# Altium footprint library Libraries_2014_0618.PcbLib: 391 footprints (part 9 of 25)
Each footprint in its own frame and in the unit in brackets; x right, y up, seen from the top. Pads: shape width x height; smd on the part's side, far side on the other; paste and mask are expansions set on the pad; w line width, h text height; cw(c..) or ccw(c..) is an arc to the next point about the centre after c.
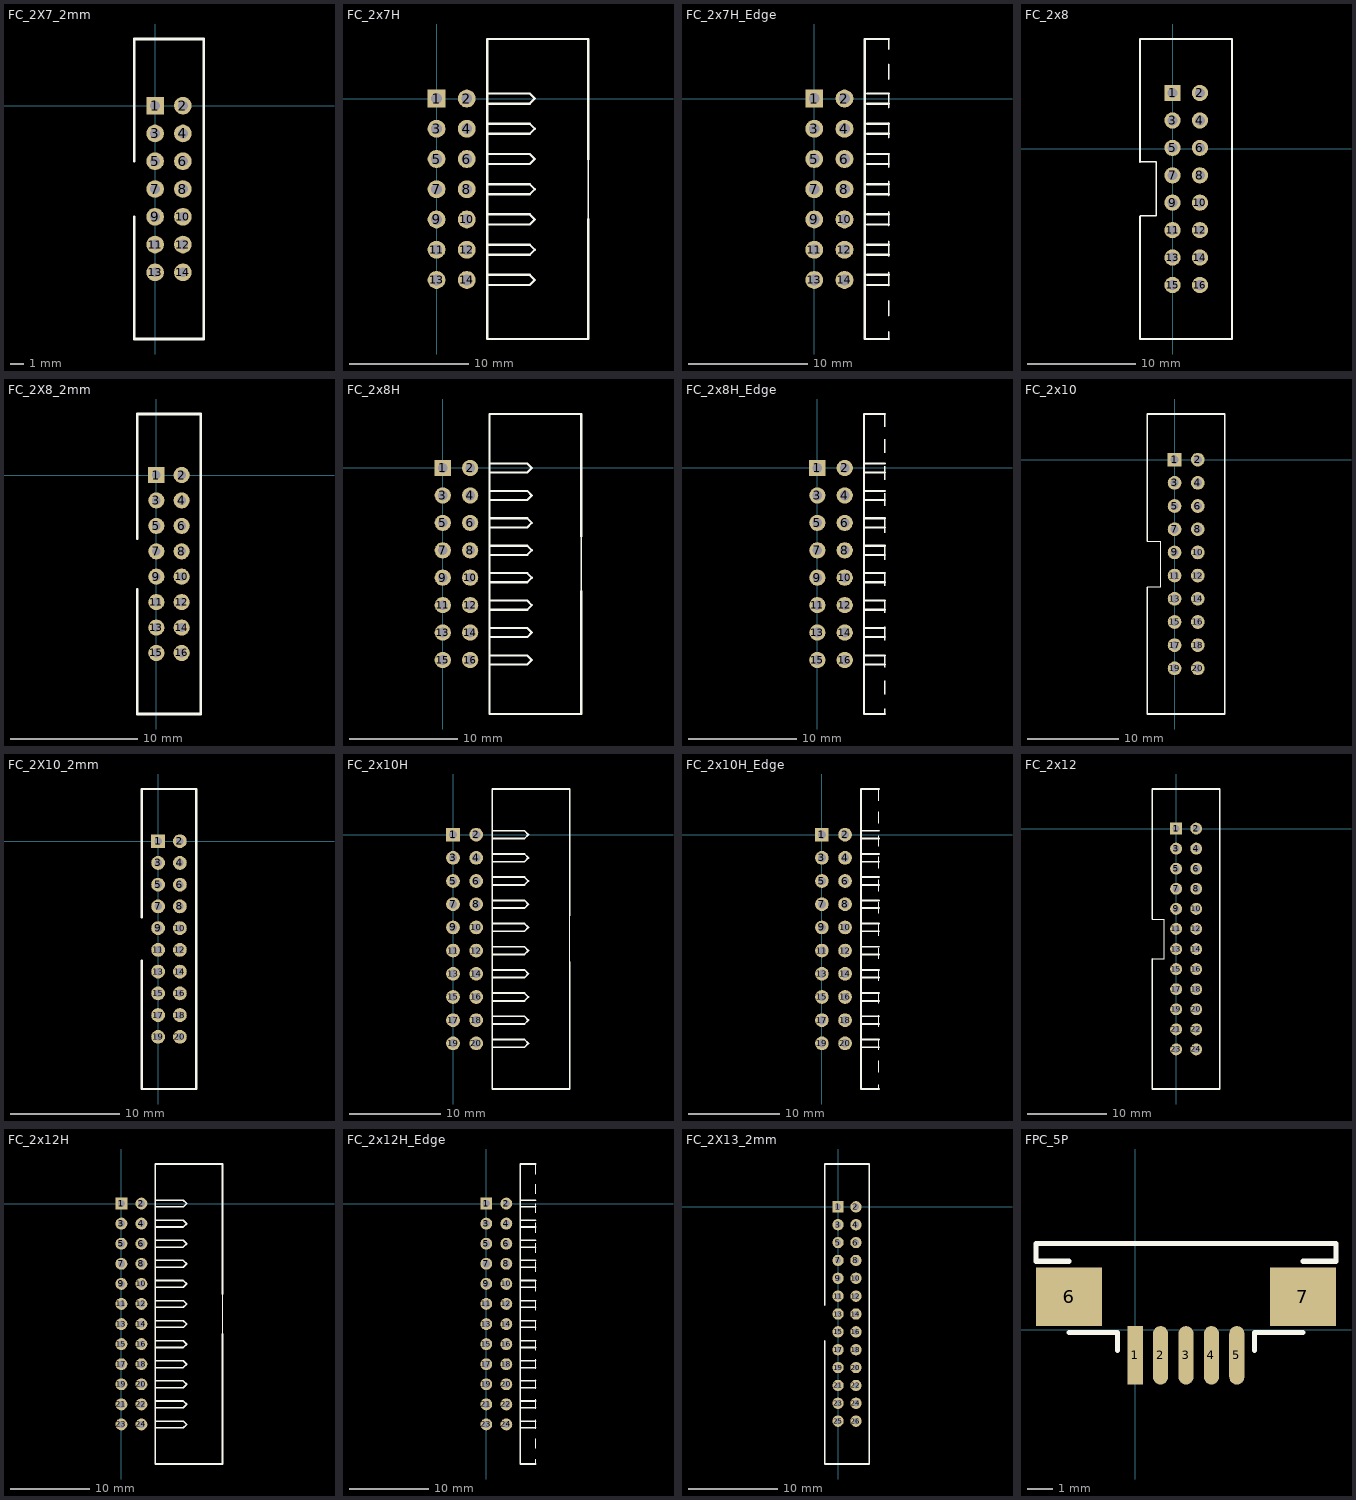
[diagram p8: the footprints below, top view; thin cyan lines are the x and y axes]

## FC_2X7_2mm [mm]
pads (14):
  rect 1.27x1.27 hole 0.7: 1(0,0)
  round 1.27 hole 0.7: 2(2,0) 3(0,-2) 4(2,-2) 5(0,-4) 6(2,-4) 7(0,-6) 8(2,-6) 9(0,-8) 10(2,-8) 11(0,-10) 12(2,-10) 13(0,-12) 14(2,-12)
Top Overlay:
  lines w0.2: -1.5,-8 -1.5,-16.8 3.5,-16.8 3.5,4.8 -1.5,4.8 -1.5,-4

## FC_2x7H [mm] "Connector; Header; 6x2 Position"
pads (14):
  rect 1.5x1.5 hole 0.9: 1(0,0)
  round 1.5 hole 0.9: 2(2.54,0) 3(0,-2.54) 4(2.54,-2.54) 5(0,-5.08) 6(2.54,-5.08) 7(0,-7.62) 8(2.54,-7.62) 9(0,-10.16) 10(2.54,-10.16) 11(0,-12.7) 12(2.54,-12.7) 13(0,-15.24) 14(2.54,-15.24)
Top Overlay:
  lines w0.127: 12.75,-10.12 12.75,-5.12
  lines w0.2: 4.44,-15.663 7.827,-15.663 8.25,-15.24 7.827,-14.817 4.44,-14.817 ; 4.44,-13.123 7.827,-13.123 8.25,-12.7 7.827,-12.277 4.44,-12.277 ; 4.44,-10.583 7.827,-10.583 8.25,-10.16 7.827,-9.737 4.44,-9.737 ; 4.44,-8.043 7.827,-8.043 8.25,-7.62 7.827,-7.197 4.44,-7.197 ; 4.44,-5.503 7.827,-5.503 8.25,-5.08 7.827,-4.657 4.44,-4.657 ; 4.44,-2.963 7.827,-2.963 8.25,-2.54 7.827,-2.117 4.44,-2.117 ; 4.44,-0.423 7.827,-0.423 8.25,0 7.827,0.423 4.44,0.423 ; 12.75,-10.14 12.75,-12.66 12.75,-20.2 4.25,-20.2 4.25,5 ; 12.75,-5.1 12.75,-2.58 12.75,5 ; 4.25,5 12.75,5 ; 4.25,5 12.75,5

## FC_2x7H_Edge [mm] "Connector; Header; 6x2 Position"
pads (14):
  rect 1.5x1.5 hole 0.9: 1(0,0)
  round 1.5 hole 0.9: 2(2.54,0) 3(0,-2.54) 4(2.54,-2.54) 5(0,-5.08) 6(2.54,-5.08) 7(0,-7.62) 8(2.54,-7.62) 9(0,-10.16) 10(2.54,-10.16) 11(0,-12.7) 12(2.54,-12.7) 13(0,-15.24) 14(2.54,-15.24)
Top Overlay:
  lines w0.127: 6.25,-20.2 6.25,-19.575 ; 6.25,-18.235 6.25,-16.985 ; 6.25,-15.735 6.25,-14.575 ; 6.25,-13.235 6.25,-11.985 ; 6.25,-10.685 6.25,-9.525 ; 6.25,-8.185 6.25,-6.935 ; 6.25,-5.785 6.25,-4.625 ; 6.25,-3.285 6.25,-2.035 ; 6.25,-0.785 6.25,0.375 ; 6.25,1.625 6.25,2.875 ; 6.25,4.125 6.25,4.91
  lines w0.2: 4.44,-15.663 6.25,-15.663 ; 4.44,-14.817 6.25,-14.817 ; 4.44,-13.123 6.25,-13.123 ; 4.44,-12.277 6.25,-12.277 ; 4.44,-10.583 6.25,-10.583 ; 4.44,-9.737 6.25,-9.737 ; 4.44,-8.043 6.25,-8.043 ; 4.44,-7.197 6.25,-7.197 ; 4.44,-5.503 6.25,-5.503 ; 4.44,-4.657 6.25,-4.657 ; 4.44,-2.963 6.25,-2.963 ; 4.44,-2.117 6.25,-2.117 ; 4.44,-0.423 6.25,-0.423 ; 4.44,0.423 6.25,0.423 ; 6.25,-20.2 4.25,-20.2 4.25,5 6.25,5

## FC_2x8 [mm] "Connector; Header; 6x2 Position"
pads (16):
  rect 1.5x1.5 hole 0.9: 1(0,5.16)
  round 1.5 hole 0.9: 2(2.54,5.16) 3(0,2.62) 4(2.54,2.62) 5(0,0.08) 6(2.54,0.08) 7(0,-2.46) 8(2.54,-2.46) 9(0,-5) 10(2.54,-5) 11(0,-7.54) 12(2.54,-7.54) 13(0,-10.08) 14(2.54,-10.08) 15(0,-12.62) 16(2.54,-12.62)
Top Overlay:
  lines w0.127: -3,-6.22 -1.5,-6.22 -1.5,-1.22 -3,-1.22
  lines w0.2: -3,-6.27 -3,-8.79 -3,-17.62 5.5,-17.62 5.5,10.16 -3,10.16 -3,0.04 -3,-1.22

## FC_2X8_2mm [mm]
pads (16):
  rect 1.27x1.27 hole 0.7: 1(0,0)
  round 1.27 hole 0.7: 2(2,0) 3(0,-2) 4(2,-2) 5(0,-4) 6(2,-4) 7(0,-6) 8(2,-6) 9(0,-8) 10(2,-8) 11(0,-10) 12(2,-10) 13(0,-12) 14(2,-12) 15(0,-14) 16(2,-14)
Top Overlay:
  lines w0.2: -1.5,-9 -1.5,-18.8 3.5,-18.8 3.5,4.8 -1.5,4.8 -1.5,-5

## FC_2x8H [mm] "Connector; Header; 6x2 Position"
pads (16):
  rect 1.5x1.5 hole 0.9: 1(0,0)
  round 1.5 hole 0.9: 2(2.54,0) 3(0,-2.54) 4(2.54,-2.54) 5(0,-5.08) 6(2.54,-5.08) 7(0,-7.62) 8(2.54,-7.62) 9(0,-10.16) 10(2.54,-10.16) 11(0,-12.7) 12(2.54,-12.7) 13(0,-15.24) 14(2.54,-15.24) 15(0,-17.78) 16(2.54,-17.78)
Top Overlay:
  lines w0.127: 12.83,-11.4 12.83,-6.4
  lines w0.2: 4.44,-18.203 7.827,-18.203 8.25,-17.78 7.827,-17.357 4.44,-17.357 ; 4.44,-15.663 7.827,-15.663 8.25,-15.24 7.827,-14.817 4.44,-14.817 ; 4.44,-13.123 7.827,-13.123 8.25,-12.7 7.827,-12.277 4.44,-12.277 ; 4.44,-10.583 7.827,-10.583 8.25,-10.16 7.827,-9.737 4.44,-9.737 ; 4.44,-8.043 7.827,-8.043 8.25,-7.62 7.827,-7.197 4.44,-7.197 ; 4.44,-5.503 7.827,-5.503 8.25,-5.08 7.827,-4.657 4.44,-4.657 ; 4.44,-2.963 7.827,-2.963 8.25,-2.54 7.827,-2.117 4.44,-2.117 ; 4.44,-0.423 7.827,-0.423 8.25,0 7.827,0.423 4.44,0.423 ; 12.83,-11.4 12.83,-12.66 12.83,-22.78 4.33,-22.78 4.33,5 12.83,5 12.83,-3.83 12.83,-6.35

## FC_2x8H_Edge [mm] "Connector; Header; 6x2 Position"
pads (16):
  rect 1.5x1.5 hole 0.9: 1(0,0)
  round 1.5 hole 0.9: 2(2.54,0) 3(0,-2.54) 4(2.54,-2.54) 5(0,-5.08) 6(2.54,-5.08) 7(0,-7.62) 8(2.54,-7.62) 9(0,-10.16) 10(2.54,-10.16) 11(0,-12.7) 12(2.54,-12.7) 13(0,-15.24) 14(2.54,-15.24) 15(0,-17.78) 16(2.54,-17.78)
Top Overlay:
  lines w0.127: 6.25,-22.78 6.25,-22.295 ; 6.25,-20.955 6.25,-19.705 ; 6.25,-18.455 6.25,-17.295 ; 6.25,-15.955 6.25,-14.705 ; 6.25,-13.405 6.25,-12.245 ; 6.25,-10.905 6.25,-9.655 ; 6.25,-8.505 6.25,-7.345 ; 6.25,-6.005 6.25,-4.755 ; 6.25,-3.505 6.25,-2.345 ; 6.25,-1.095 6.25,0.155 ; 6.25,1.405 6.25,2.19 ; 6.25,1.425 6.25,2.675 ; 6.25,3.825 6.25,4.985
  lines w0.2: 4.44,-18.203 6.25,-18.203 ; 4.44,-17.357 6.25,-17.357 ; 4.44,-15.663 6.25,-15.663 ; 4.44,-14.817 6.25,-14.817 ; 4.44,-13.123 6.25,-13.123 ; 4.44,-12.277 6.25,-12.277 ; 4.44,-10.583 6.25,-10.583 ; 4.44,-9.737 6.25,-9.737 ; 4.44,-8.043 6.25,-8.043 ; 4.44,-7.197 6.25,-7.197 ; 4.44,-5.503 6.25,-5.503 ; 4.44,-4.657 6.25,-4.657 ; 4.44,-2.963 6.25,-2.963 ; 4.44,-2.117 6.25,-2.117 ; 4.44,-0.423 6.25,-0.423 ; 4.44,0.423 6.25,0.423 ; 6.25,-22.78 4.33,-22.78 4.33,5 6.25,5

## FC_2x10 [mm] "Connector; Header; 6x2 Position"
pads (20):
  rect 1.5x1.5 hole 0.9: 1(0,0)
  round 1.5 hole 0.9: 2(2.54,0) 3(0,-2.54) 4(2.54,-2.54) 5(0,-5.08) 6(2.54,-5.08) 7(0,-7.62) 8(2.54,-7.62) 9(0,-10.16) 10(2.54,-10.16) 11(0,-12.7) 12(2.54,-12.7) 13(0,-15.24) 14(2.54,-15.24) 15(0,-17.78) 16(2.54,-17.78) 17(0,-20.32) 18(2.54,-20.32) 19(0,-22.86) 20(2.54,-22.86)
Top Overlay:
  lines w0.127: -3,-13.92 -1.5,-13.92 -1.5,-8.92 -3,-8.92
  lines w0.2: -3,-13.97 -3,-16.49 -3,-27.86 5.5,-27.86 5.5,5 -3,5 -3,-5.12 -3,-8.92

## FC_2X10_2mm [mm]
pads (20):
  rect 1.27x1.27 hole 0.7: 1(0,0)
  round 1.27 hole 0.7: 2(2,0) 3(0,-2) 4(2,-2) 5(0,-4) 6(2,-4) 7(0,-6) 8(2,-6) 9(0,-8) 10(2,-8) 11(0,-10) 12(2,-10) 13(0,-12) 14(2,-12) 15(0,-14) 16(2,-14) 17(0,-16) 18(2,-16) 19(0,-18) 20(2,-18)
Top Overlay:
  lines w0.2: -1.5,-11 -1.5,-22.8 3.5,-22.8 3.5,4.8 -1.5,4.8 -1.5,-7

## FC_2x10H [mm] "Connector; Header; 6x2 Position"
pads (20):
  rect 1.5x1.5 hole 0.9: 1(0,0)
  round 1.5 hole 0.9: 2(2.54,0) 3(0,-2.54) 4(2.54,-2.54) 5(0,-5.08) 6(2.54,-5.08) 7(0,-7.62) 8(2.54,-7.62) 9(0,-10.16) 10(2.54,-10.16) 11(0,-12.7) 12(2.54,-12.7) 13(0,-15.24) 14(2.54,-15.24) 15(0,-17.78) 16(2.54,-17.78) 17(0,-20.32) 18(2.54,-20.32) 19(0,-22.86) 20(2.54,-22.86)
Top Overlay:
  lines w0.127: 12.79,-13.94 12.79,-8.94
  lines w0.2: 4.44,-23.283 7.827,-23.283 8.25,-22.86 7.827,-22.437 4.44,-22.437 ; 4.44,-20.743 7.827,-20.743 8.25,-20.32 7.827,-19.897 4.44,-19.897 ; 4.44,-18.203 7.827,-18.203 8.25,-17.78 7.827,-17.357 4.44,-17.357 ; 4.44,-15.663 7.827,-15.663 8.25,-15.24 7.827,-14.817 4.44,-14.817 ; 4.44,-13.123 7.827,-13.123 8.25,-12.7 7.827,-12.277 4.44,-12.277 ; 4.44,-10.583 7.827,-10.583 8.25,-10.16 7.827,-9.737 4.44,-9.737 ; 4.44,-8.043 7.827,-8.043 8.25,-7.62 7.827,-7.197 4.44,-7.197 ; 4.44,-5.503 7.827,-5.503 8.25,-5.08 7.827,-4.657 4.44,-4.657 ; 4.44,-2.963 7.827,-2.963 8.25,-2.54 7.827,-2.117 4.44,-2.117 ; 4.44,-0.423 7.827,-0.423 8.25,0 7.827,0.423 4.44,0.423 ; 12.79,-13.94 12.79,-17.74 12.79,-27.86 4.29,-27.86 4.29,5 12.79,5 12.79,-6.37 12.79,-8.89

## FC_2x10H_Edge [mm] "Connector; Header; 6x2 Position"
pads (20):
  rect 1.5x1.5 hole 0.9: 1(0,0)
  round 1.5 hole 0.9: 2(2.54,0) 3(0,-2.54) 4(2.54,-2.54) 5(0,-5.08) 6(2.54,-5.08) 7(0,-7.62) 8(2.54,-7.62) 9(0,-10.16) 10(2.54,-10.16) 11(0,-12.7) 12(2.54,-12.7) 13(0,-15.24) 14(2.54,-15.24) 15(0,-17.78) 16(2.54,-17.78) 17(0,-20.32) 18(2.54,-20.32) 19(0,-22.86) 20(2.54,-22.86)
Top Overlay:
  lines w0.127: 6.25,-27.86 6.25,-27.375 ; 6.25,-26.035 6.25,-24.785 ; 6.25,-23.535 6.25,-22.375 ; 6.25,-21.035 6.25,-19.785 ; 6.25,-18.485 6.25,-17.325 ; 6.25,-15.985 6.25,-14.735 ; 6.25,-13.585 6.25,-12.425 ; 6.25,-11.085 6.25,-9.835 ; 6.25,-8.585 6.25,-7.425 ; 6.25,-6.175 6.25,-4.925 ; 6.25,-3.675 6.25,-2.89 ; 6.25,-3.655 6.25,-2.405 ; 6.25,-1.255 6.25,-0.095 ; 6.25,1.245 6.25,2.495 ; 6.25,3.715 6.25,5
  lines w0.2: 4.44,-23.283 6.25,-23.283 ; 4.44,-22.437 6.25,-22.437 ; 4.44,-20.743 6.25,-20.743 ; 4.44,-19.897 6.25,-19.897 ; 4.44,-18.203 6.25,-18.203 ; 4.44,-17.357 6.25,-17.357 ; 4.44,-15.663 6.25,-15.663 ; 4.44,-14.817 6.25,-14.817 ; 4.44,-13.123 6.25,-13.123 ; 4.44,-12.277 6.25,-12.277 ; 4.44,-10.583 6.25,-10.583 ; 4.44,-9.737 6.25,-9.737 ; 4.44,-8.043 6.25,-8.043 ; 4.44,-7.197 6.25,-7.197 ; 4.44,-5.503 6.25,-5.503 ; 4.44,-4.657 6.25,-4.657 ; 4.44,-2.963 6.25,-2.963 ; 4.44,-2.117 6.25,-2.117 ; 4.44,-0.423 6.25,-0.423 ; 4.44,0.423 6.25,0.423 ; 6.25,-27.86 4.29,-27.86 4.29,5 6.25,5

## FC_2x12 [mm] "Connector; Header; 6x2 Position"
pads (24):
  rect 1.5x1.5 hole 0.9: 1(0,0)
  round 1.5 hole 0.9: 2(2.54,0) 3(0,-2.54) 4(2.54,-2.54) 5(0,-5.08) 6(2.54,-5.08) 7(0,-7.62) 8(2.54,-7.62) 9(0,-10.16) 10(2.54,-10.16) 11(0,-12.7) 12(2.54,-12.7) 13(0,-15.24) 14(2.54,-15.24) 15(0,-17.78) 16(2.54,-17.78) 17(0,-20.32) 18(2.54,-20.32) 19(0,-22.86) 20(2.54,-22.86) 21(0,-25.4) 22(2.54,-25.4) 23(0,-27.94) 24(2.54,-27.94)
Top Overlay:
  lines w0.127: -3,-16.46 -1.5,-16.46 -1.5,-11.46 -3,-11.46
  lines w0.2: -3,-16.49 -3,-32.94 5.5,-32.94 5.5,5 -3,5 -3,-5.12 -3,-11.46

## FC_2x12H [mm] "Connector; Header; 6x2 Position"
pads (24):
  rect 1.5x1.5 hole 0.9: 1(0,0)
  round 1.5 hole 0.9: 2(2.54,0) 3(0,-2.54) 4(2.54,-2.54) 5(0,-5.08) 6(2.54,-5.08) 7(0,-7.62) 8(2.54,-7.62) 9(0,-10.16) 10(2.54,-10.16) 11(0,-12.7) 12(2.54,-12.7) 13(0,-15.24) 14(2.54,-15.24) 15(0,-17.78) 16(2.54,-17.78) 17(0,-20.32) 18(2.54,-20.32) 19(0,-22.86) 20(2.54,-22.86) 21(0,-25.4) 22(2.54,-25.4) 23(0,-27.94) 24(2.54,-27.94)
Top Overlay:
  lines w0.127: 12.79,-16.48 12.79,-11.48
  lines w0.2: 4.44,-28.363 7.827,-28.363 8.25,-27.94 7.827,-27.517 4.44,-27.517 ; 4.44,-25.823 7.827,-25.823 8.25,-25.4 7.827,-24.977 4.44,-24.977 ; 4.44,-23.283 7.827,-23.283 8.25,-22.86 7.827,-22.437 4.44,-22.437 ; 4.44,-20.743 7.827,-20.743 8.25,-20.32 7.827,-19.897 4.44,-19.897 ; 4.44,-18.203 7.827,-18.203 8.25,-17.78 7.827,-17.357 4.44,-17.357 ; 4.44,-15.663 7.827,-15.663 8.25,-15.24 7.827,-14.817 4.44,-14.817 ; 4.44,-13.123 7.827,-13.123 8.25,-12.7 7.827,-12.277 4.44,-12.277 ; 4.44,-10.583 7.827,-10.583 8.25,-10.16 7.827,-9.737 4.44,-9.737 ; 4.44,-8.043 7.827,-8.043 8.25,-7.62 7.827,-7.197 4.44,-7.197 ; 4.44,-5.503 7.827,-5.503 8.25,-5.08 7.827,-4.657 4.44,-4.657 ; 4.44,-2.963 7.827,-2.963 8.25,-2.54 7.827,-2.117 4.44,-2.117 ; 4.44,-0.423 7.827,-0.423 8.25,0 7.827,0.423 4.44,0.423 ; 12.79,-16.48 12.79,-22.82 12.79,-32.94 4.29,-32.94 4.29,5 12.79,5 12.79,-11.45

## FC_2x12H_Edge [mm] "Connector; Header; 6x2 Position"
pads (24):
  rect 1.5x1.5 hole 0.9: 1(0,0)
  round 1.5 hole 0.9: 2(2.54,0) 3(0,-2.54) 4(2.54,-2.54) 5(0,-5.08) 6(2.54,-5.08) 7(0,-7.62) 8(2.54,-7.62) 9(0,-10.16) 10(2.54,-10.16) 11(0,-12.7) 12(2.54,-12.7) 13(0,-15.24) 14(2.54,-15.24) 15(0,-17.78) 16(2.54,-17.78) 17(0,-20.32) 18(2.54,-20.32) 19(0,-22.86) 20(2.54,-22.86) 21(0,-25.4) 22(2.54,-25.4) 23(0,-27.94) 24(2.54,-27.94)
Top Overlay:
  lines w0.127: 6.25,-32.94 6.25,-32.315 ; 6.25,-30.975 6.25,-29.725 ; 6.25,-28.475 6.25,-27.315 ; 6.25,-25.975 6.25,-24.725 ; 6.25,-23.425 6.25,-22.265 ; 6.25,-20.925 6.25,-19.675 ; 6.25,-18.525 6.25,-17.365 ; 6.25,-16.025 6.25,-14.775 ; 6.25,-13.525 6.25,-12.365 ; 6.25,-11.115 6.25,-9.865 ; 6.25,-8.615 6.25,-7.83 ; 6.25,-8.595 6.25,-7.345 ; 6.25,-6.195 6.25,-5.035 ; 6.25,-3.695 6.25,-2.445 ; 6.25,-1.195 6.25,-0.035 ; 6.25,1.215 6.25,2.465 ; 6.25,3.715 6.25,5
  lines w0.2: 4.44,-28.363 6.25,-28.363 ; 4.44,-27.517 6.25,-27.517 ; 4.44,-25.823 6.25,-25.823 ; 4.44,-24.977 6.25,-24.977 ; 4.44,-23.283 6.25,-23.283 ; 4.44,-22.437 6.25,-22.437 ; 4.44,-20.743 6.25,-20.743 ; 4.44,-19.897 6.25,-19.897 ; 4.44,-18.203 6.25,-18.203 ; 4.44,-17.357 6.25,-17.357 ; 4.44,-15.663 6.25,-15.663 ; 4.44,-14.817 6.25,-14.817 ; 4.44,-13.123 6.25,-13.123 ; 4.44,-12.277 6.25,-12.277 ; 4.44,-10.583 6.25,-10.583 ; 4.44,-9.737 6.25,-9.737 ; 4.44,-8.043 6.25,-8.043 ; 4.44,-7.197 6.25,-7.197 ; 4.44,-5.503 6.25,-5.503 ; 4.44,-4.657 6.25,-4.657 ; 4.44,-2.963 6.25,-2.963 ; 4.44,-2.117 6.25,-2.117 ; 4.44,-0.423 6.25,-0.423 ; 4.44,0.423 6.25,0.423 ; 6.25,-32.94 4.29,-32.94 4.29,5 6.25,5

## FC_2X13_2mm [mm]
pads (26):
  rect 1.27x1.27 hole 0.7: 1(0,0)
  round 1.27 hole 0.7: 2(2,0) 3(0,-2) 4(2,-2) 5(0,-4) 6(2,-4) 7(0,-6) 8(2,-6) 9(0,-8) 10(2,-8) 11(0,-10) 12(2,-10) 13(0,-12) 14(2,-12) 15(0,-14) 16(2,-14) 17(0,-16) 18(2,-16) 19(0,-18) 20(2,-18) 21(0,-20) 22(2,-20) 23(0,-22) 24(2,-22) 25(0,-24) 26(2,-24)
Top Overlay:
  lines w0.2: -1.5,-15 -1.5,-28.8 3.5,-28.8 3.5,4.8 -1.5,4.8 -1.5,-11

## FPC_5P [mm]
pads (7):
  rect 0.6x2.3 smd: 1(0,-1)
  oval 0.6x2.3 smd: 2(1,-1) 3(2,-1) 4(3,-1) 5(4,-1)
  rect 2.6x2.3 smd: 6(-2.6,1.3) 7(6.6,1.3)
Top Overlay:
  lines w0.2: -2.6,-0.1 -0.7,-0.1 -0.7,-0.8 ; -2.6,2.7 -3.9,2.7 -3.9,2.9 -3.9,3.4 7.9,3.4 7.9,2.7 6.6,2.7 ; 4.7,-0.8 4.7,-0.1 6.6,-0.1